# Altium footprint library cool_library.PcbLib: 1182 footprints (part 64 of 75)
Each footprint in its own frame and in the unit in brackets; x right, y up, seen from the top. Pads: shape width x height; smd on the part's side, far side on the other; paste and mask are expansions set on the pad; w line width, h text height; cw(c..) or ccw(c..) is an arc to the next point about the centre after c.
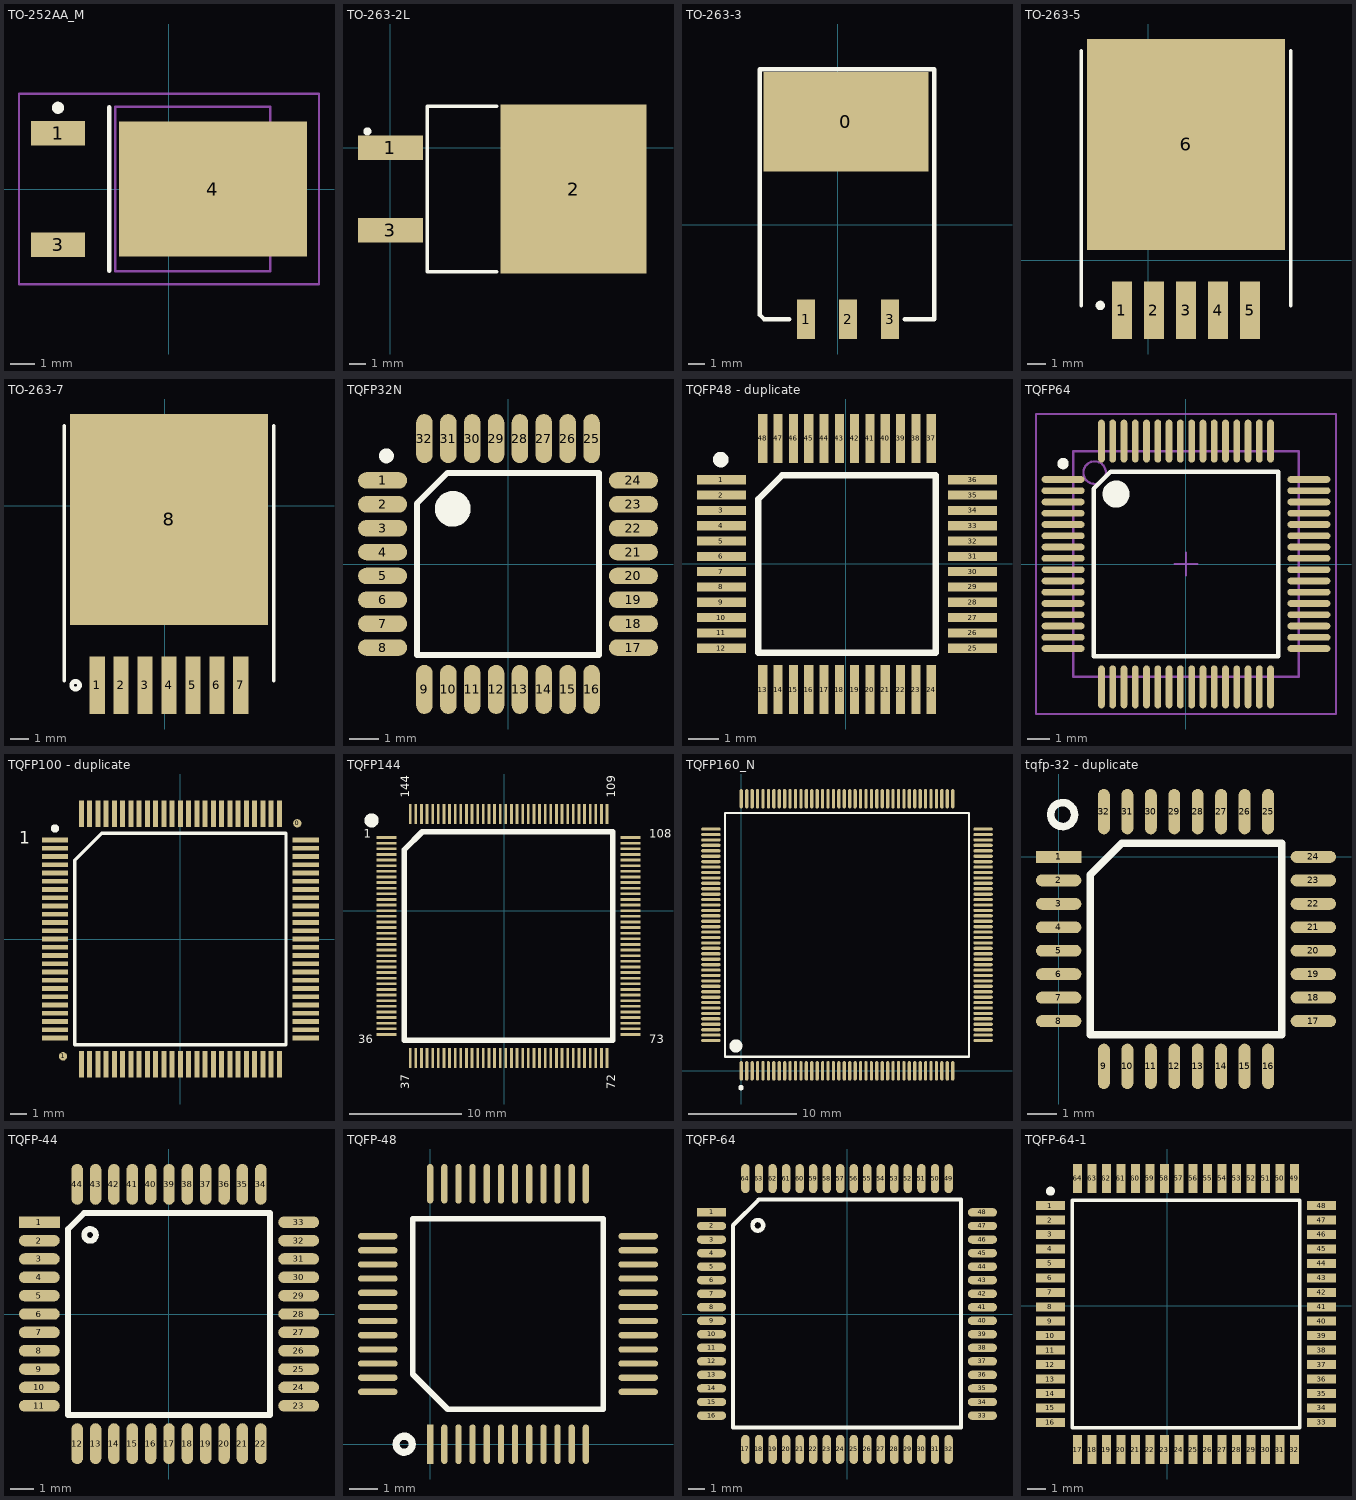
[diagram p63: the footprints below, top view; thin cyan lines are the x and y axes]

## TO-252AA_M [mm] "D-PAK, 4-Leads, Body 6.1x6.5mm, Pitch 2.28mm, Lead Span 9.9mm, IPC Low Density"
height 2.38
pads (3):
  rect 2.2x1 smd: 1(-4.55,2.28) 3(-4.55,-2.28)
  rect 7.7x5.55 smd: 4(1.8,0)
Top Overlay:
  circle w0.25: c-4.55,3.33 r0.125
  lines w0.2: -2.45,-3.35 -2.45,3.35
Mechanical 13:
  lines w0.1: -2.2,-3.375 4.15,-3.375 4.15,3.375 -2.2,3.375 -2.2,-3.375
Mechanical 15:
  lines w0.1: -0.5,0 0.5,0 ; 0,-0.5 0,0.5 ; -6.15,-3.9 6.15,-3.9 6.15,3.9 -6.15,3.9 -6.15,-3.9
3D body: height 2.38, standoff 0, extent -2.2,-3.375 4.15,3.375

## TO-263-2L [mm]
height 8.23
pads (3):
  rect 4x1.5 smd: 1(0,0) 3(0,-5.08)
  rect 9x10.4 smd: 2(11.303,-2.54)
Top Overlay:
  circle w0.25: c-1.423,1.01 r0.125
  lines w0.203: 6.577,-7.64 2.277,-7.64 2.277,2.56 6.577,2.56

## TO-263-3 [mm] "贴片封装"
pads (4):
  rect 10x6 smd: 0(0.508,6.223)
  rect 1.07x2.4 smd: 1(-1.905,-5.715) 2(0.635,-5.715) 3(3.175,-5.715)
Top Overlay:
  lines w0.254: -2.921,-5.715 -4.445,-5.715 -4.699,-5.461 -4.699,9.398 5.842,9.398 5.842,-5.715 4.064,-5.715

## TO-263-5 [mil]
pads (6):
  rect 42x120 smd: 1(-55,-104) 2(11.93,-104) 3(78.86,-104) 4(145.79,-104) 5(212.72,-104)
  rect 414x440 smd: 6(78.86,242)
Top Overlay:
  circle w9.84: c-99.92,-94 r4.92
  lines w7.87: -139.65,-94 -139.65,437.5 ; 297.36,-94 297.36,437.5

## TO-263-7 [mil]
pads (8):
  rect 32x120 smd: 1(-141,-375) 2(-91,-375) 3(-41,-375) 4(9,-375) 5(59,-375) 6(109,-375) 7(159,-375)
  rect 414x440 smd: 8(9,-29)
Top Overlay:
  circle w9.84: c-185.92,-375 r8.08
  lines w7.87: -209.5,-365 -209.5,166.5 ; 227.5,-365 227.5,166.5

## TQFP32N [mm] "TQFP, 32-Leads, Body 9.0x9.0mm (max), Pitch 0.80mm, IPC Medium Density"
height 1.2
pads (32):
  oval 1.65x0.55 smd: 1(-4.202,2.8) 2(-4.202,2) 3(-4.202,1.2) 4(-4.202,0.4) 5(-4.202,-0.4) 6(-4.202,-1.2) 7(-4.202,-2) 8(-4.202,-2.8) 17(4.202,-2.8) 18(4.202,-2) 19(4.202,-1.2) 20(4.202,-0.4) 21(4.202,0.4) 22(4.202,1.2) 23(4.202,2) 24(4.202,2.8)
  oval 0.55x1.65 smd: 9(-2.8,-4.202) 10(-2,-4.202) 11(-1.2,-4.202) 12(-0.4,-4.202) 13(0.4,-4.202) 14(1.2,-4.202) 15(2,-4.202) 16(2.8,-4.202) 25(2.8,4.202) 26(2,4.202) 27(1.2,4.202) 28(0.4,4.202) 29(-0.4,4.202) 30(-1.2,4.202) 31(-2,4.202) 32(-2.8,4.202)
Top Overlay:
  circle w0.6: c-1.85,1.85 r0.3
  circle w0.25: c-4.075,3.625 r0.125
  lines w0.2: -3.048,-3.048 -3.048,2.032 -2.032,3.048 3.048,3.048 3.048,-3.048 -3.048,-3.048
3D body: height 1.1, standoff 0, extent -4.509,-4.483 4.509,4.534

## TQFP48 - duplicate [mm]
pads (48):
  rect 1.6x0.3 smd: 1(-4.064,2.743) 2(-4.064,2.243) 3(-4.064,1.743) 4(-4.064,1.243) 5(-4.064,0.743) 6(-4.064,0.243) 7(-4.064,-0.257) 8(-4.064,-0.757) 9(-4.064,-1.257) 10(-4.064,-1.757) 11(-4.064,-2.257) 12(-4.064,-2.757) 25(4.136,-2.757) 26(4.136,-2.257) 27(4.136,-1.757) 28(4.136,-1.257) 29(4.136,-0.757) 30(4.136,-0.257) 31(4.136,0.243) 32(4.136,0.743) 33(4.136,1.243) 34(4.136,1.743) 35(4.136,2.243) 36(4.136,2.743)
  rect 0.3x1.6 smd: 13(-2.714,-4.107) 14(-2.214,-4.107) 15(-1.714,-4.107) 16(-1.214,-4.107) 17(-0.714,-4.107) 18(-0.214,-4.107) 19(0.286,-4.107) 20(0.786,-4.107) 21(1.286,-4.107) 22(1.786,-4.107) 23(2.286,-4.107) 24(2.786,-4.107) 37(2.786,4.093) 38(2.286,4.093) 39(1.786,4.093) 40(1.286,4.093) 41(0.786,4.093) 42(0.286,4.093) 43(-0.214,4.093) 44(-0.714,4.093) 45(-1.214,4.093) 46(-1.714,4.093) 47(-2.214,4.093) 48(-2.714,4.093)
Top Overlay:
  circle w0.254: c-4.089,3.404 r0.127
  lines w0.2: -2.864,-2.907 2.936,-2.907 2.936,2.893
  lines w0.203: -2.864,-2.907 -2.864,2.114 -2.085,2.893 2.936,2.893
3D body: height 1.1, standoff 0, extent -4.483,-4.509 4.534,4.509

## TQFP64 [mm]
pads (64):
  oval 1.9x0.3 smd: 1(-5.45,3.75) 2(-5.45,3.25) 3(-5.45,2.75) 4(-5.45,2.25) 5(-5.45,1.75) 6(-5.45,1.25) 7(-5.45,0.75) 8(-5.45,0.25) 9(-5.45,-0.25) 10(-5.45,-0.75) 11(-5.45,-1.25) 12(-5.45,-1.75) 13(-5.45,-2.25) 14(-5.45,-2.75) 15(-5.45,-3.25) 16(-5.45,-3.75) 33(5.45,-3.75) 34(5.45,-3.25) 35(5.45,-2.75) 36(5.45,-2.25) 37(5.45,-1.75) 38(5.45,-1.25) 39(5.45,-0.75) 40(5.45,-0.25) 41(5.45,0.25) 42(5.45,0.75) 43(5.45,1.25) 44(5.45,1.75) 45(5.45,2.25) 46(5.45,2.75) 47(5.45,3.25) 48(5.45,3.75)
  oval 0.3x1.9 smd: 17(-3.75,-5.45) 18(-3.25,-5.45) 19(-2.75,-5.45) 20(-2.25,-5.45) 21(-1.75,-5.45) 22(-1.25,-5.45) 23(-0.75,-5.45) 24(-0.25,-5.45) 25(0.25,-5.45) 26(0.75,-5.45) 27(1.25,-5.45) 28(1.75,-5.45) 29(2.25,-5.45) 30(2.75,-5.45) 31(3.25,-5.45) 32(3.75,-5.45) 49(3.75,5.45) 50(3.25,5.45) 51(2.75,5.45) 52(2.25,5.45) 53(1.75,5.45) 54(1.25,5.45) 55(0.75,5.45) 56(0.25,5.45) 57(-0.25,5.45) 58(-0.75,5.45) 59(-1.25,5.45) 60(-1.75,5.45) 61(-2.25,5.45) 62(-2.75,5.45) 63(-3.25,5.45) 64(-3.75,5.45)
Top Overlay:
  circle w0.6: c-3.1,3.1 r0.3
  circle w0.25: c-5.45,4.45 r0.125
  lines w0.2: -4.1,-4.1 4.1,-4.1 4.1,4.1 -3.342,4.1 -4.1,3.342 -4.1,-4.1
Mechanical 13:
  circle w0.1: c-4.05,4.05 r0.5
  lines w0.1: -5,-5 5,-5 5,5 -5,5 -5,-5
Mechanical 15:
  lines w0.1: -0.5,0 0.5,0 ; 0,-0.5 0,0.5 ; -6.65,-6.65 6.65,-6.65 6.65,6.65 -6.65,6.65 -6.65,-6.65
3D body: height 1, standoff -0.06, extent -6,-6.006 6,5.994

## TQFP100 - duplicate [mm]
pads (102):
  round 0.508 smd: 0(7.087,7.01) 1(-7.112,-7.112)
  rect 1.6x0.3 smd: 1(-7.6,6) 2(-7.6,5.5) 3(-7.6,5) 4(-7.6,4.5) 5(-7.6,4) 6(-7.6,3.5) 7(-7.6,3) 8(-7.6,2.5) 9(-7.6,2) 10(-7.6,1.5) 11(-7.6,1) 12(-7.6,0.5) 13(-7.6,0) 14(-7.6,-0.5) 15(-7.6,-1) 16(-7.6,-1.5) 17(-7.6,-2) 18(-7.6,-2.5) 19(-7.6,-3) 20(-7.6,-3.5) 21(-7.6,-4) 22(-7.6,-4.5) 23(-7.6,-5) 24(-7.6,-5.5) 25(-7.6,-6) 51(7.6,-6) 52(7.6,-5.5) 53(7.6,-5) 54(7.6,-4.5) 55(7.6,-4) 56(7.6,-3.5) 57(7.6,-3) 58(7.6,-2.5) 59(7.6,-2) 60(7.6,-1.5) 61(7.6,-1) 62(7.6,-0.5) 63(7.6,0) 64(7.6,0.5) 65(7.6,1) 66(7.6,1.5) 67(7.6,2) 68(7.6,2.5) 69(7.6,3) 70(7.6,3.5) 71(7.6,4) 72(7.6,4.5) 73(7.6,5) 74(7.6,5.5) 75(7.6,6)
  rect 0.3x1.6 smd: 26(-6,-7.6) 27(-5.5,-7.6) 28(-5,-7.6) 29(-4.5,-7.6) 30(-4,-7.6) 31(-3.5,-7.6) 32(-3,-7.6) 33(-2.5,-7.6) 34(-2,-7.6) 35(-1.5,-7.6) 36(-1,-7.6) 37(-0.5,-7.6) 38(0,-7.6) 39(0.5,-7.6) 40(1,-7.6) 41(1.5,-7.6) 42(2,-7.6) 43(2.5,-7.6) 44(3,-7.6) 45(3.5,-7.6) 46(4,-7.6) 47(4.5,-7.6) 48(5,-7.6) 49(5.5,-7.6) 50(6,-7.6) 76(6,7.6) 77(5.5,7.6) 78(5,7.6) 79(4.5,7.6) 80(4,7.6) 81(3.5,7.6) 82(3,7.6) 83(2.5,7.6) 84(2,7.6) 85(1.5,7.6) 86(1,7.6) 87(0.5,7.6) 88(0,7.6) 89(-0.5,7.6) 90(-1,7.6) 91(-1.5,7.6) 92(-2,7.6) 93(-2.5,7.6) 94(-3,7.6) 95(-3.5,7.6) 96(-4,7.6) 97(-4.5,7.6) 98(-5,7.6) 99(-5.5,7.6) 100(-6,7.6)
Top Overlay:
  circle w0.25: c-7.6,6.7 r0.125
  lines w0.2: -6.4,-6.4 -6.4,4.776 -4.776,6.4 6.4,6.4 6.4,-6.4 -6.4,-6.4
  text "1" at -9.779,5.766 h0.76
3D body: height 1.05, standoff -0.1, extent -7.949,-8.026 8.051,7.974

## TQFP144 [mil]
pads (144):
  rect 70x9.5 smd: 1(-412.2,256.3) 2(-412.2,236.61) 3(-412.2,216.93) 4(-412.2,197.24) 5(-412.2,177.56) 6(-412.2,157.87) 7(-412.2,138.19) 8(-412.2,118.5) 9(-412.2,98.82) 10(-412.2,79.13) 11(-412.2,59.45) 12(-412.2,39.76) 13(-412.2,20.08) 14(-412.2,0.39) 15(-412.2,-19.29) 16(-412.2,-38.98) 17(-412.2,-58.66) 18(-412.2,-78.35) 19(-412.2,-98.03) 20(-412.2,-117.72) 21(-412.2,-137.4) 22(-412.2,-157.09) 23(-412.2,-176.77) 24(-412.2,-196.46) 25(-412.2,-216.14) 26(-412.2,-235.83) 27(-412.2,-255.51) 28(-412.2,-275.2) 29(-412.2,-294.88) 30(-412.2,-314.57) 31(-412.2,-334.25) 32(-412.2,-353.94) 33(-412.2,-373.62) 34(-412.2,-393.31) 35(-412.2,-412.99) 36(-412.2,-432.68) 73(442.12,-432.68) 74(442.12,-412.99) 75(442.12,-393.31) 76(442.12,-373.62) 77(442.12,-353.94) 78(442.12,-334.25) 79(442.12,-314.57) 80(442.12,-294.88) 81(442.12,-275.2) 82(442.12,-255.51) 83(442.12,-235.83) 84(442.12,-216.14) 85(442.12,-196.46) 86(442.12,-176.77) 87(442.12,-157.09) 88(442.12,-137.4) 89(442.12,-117.72) 90(442.12,-98.03) 91(442.12,-78.35) 92(442.12,-58.66) 93(442.12,-38.98) 94(442.12,-19.29) 95(442.12,0.39) 96(442.12,20.08) 97(442.12,39.76) 98(442.12,59.45) 99(442.12,79.13) 100(442.12,98.82) 101(442.12,118.5) 102(442.12,138.19) 103(442.12,157.87) 104(442.12,177.56) 105(442.12,197.24) 106(442.12,216.93) 107(442.12,236.61) 108(442.12,256.3)
  rect 9.5x70 smd: 37(-329.53,-515.35) 38(-309.84,-515.35) 39(-290.16,-515.35) 40(-270.47,-515.35) 41(-250.79,-515.35) 42(-231.1,-515.35) 43(-211.42,-515.35) 44(-191.73,-515.35) 45(-172.05,-515.35) 46(-152.36,-515.35) 47(-132.68,-515.35) 48(-112.99,-515.35) 49(-93.31,-515.35) 50(-73.62,-515.35) 51(-53.94,-515.35) 52(-34.25,-515.35) 53(-14.57,-515.35) 54(5.12,-515.35) 55(24.8,-515.35) 56(44.49,-515.35) 57(64.17,-515.35) 58(83.86,-515.35) 59(103.54,-515.35) 60(123.23,-515.35) 61(142.91,-515.35) 62(162.6,-515.35) 63(182.28,-515.35) 64(201.97,-515.35) 65(221.65,-515.35) 66(241.34,-515.35) 67(261.02,-515.35) 68(280.71,-515.35) 69(300.39,-515.35) 70(320.08,-515.35) 71(339.76,-515.35) 72(359.45,-515.35) 109(359.45,338.98) 110(339.76,338.98) 111(320.08,338.98) 112(300.39,338.98) 113(280.71,338.98) 114(261.02,338.98) 115(241.34,338.98) 116(221.65,338.98) 117(201.97,338.98) 118(182.28,338.98) 119(162.6,338.98) 120(142.91,338.98) 121(123.23,338.98) 122(103.54,338.98) 123(83.86,338.98) 124(64.17,338.98) 125(44.49,338.98) 126(24.8,338.98) 127(5.12,338.98) 128(-14.57,338.98) 129(-34.25,338.98) 130(-53.94,338.98) 131(-73.62,338.98) 132(-93.31,338.98) 133(-112.99,338.98) 134(-132.68,338.98) 135(-152.36,338.98) 136(-172.05,338.98) 137(-191.73,338.98) 138(-211.42,338.98) 139(-231.1,338.98) 140(-250.79,338.98) 141(-270.47,338.98) 142(-290.16,338.98) 143(-309.84,338.98) 144(-329.53,338.98)
Top Overlay:
  circle w25: c-464.7,316.3 r12.5
  lines w19.68: -349.8,-452.95 -349.8,214.17 -287.4,276.58 379.72,276.58 379.72,-452.95 -349.8,-452.95
  text "72" at 387.8,-623.7 h30
  text "1" at -492.2,256.3 h30
  text "36" at -512.2,-463.7 h30
  text "37" at -332.2,-623.7 h30
  text "73" at 507.8,-463.7 h30
  text "108" at 507.8,256.3 h30
  text "109" at 387.8,396.3 h30
  text "144" at -332.2,396.3 h30

## TQFP160_N [mm]
pads (160):
  oval 0.3x1.8 smd: 1(0,0) 2(0.5,0) 3(1,0) 4(1.5,0) 5(2,0) 6(2.5,0) 7(3,0) 8(3.5,0) 9(4,0) 10(4.5,0) 11(5,0) 12(5.5,0) 13(6,0) 14(6.5,0) 15(7,0) 16(7.5,0) 17(8,0) 18(8.5,0) 19(9,0) 20(9.5,0) 21(10,0) 22(10.5,0) 23(11,0) 24(11.5,0) 25(12,0) 26(12.5,0) 27(13,0) 28(13.5,0) 29(14,0) 30(14.5,0) 31(15,0) 32(15.5,0) 33(16,0) 34(16.5,0) 35(17,0) 36(17.5,0) 37(18,0) 38(18.5,0) 39(19,0) 40(19.5,0) 81(19.5,25.1) 82(19,25.1) 83(18.5,25.1) 84(18,25.1) 85(17.5,25.1) 86(17,25.1) 87(16.5,25.1) 88(16,25.1) 89(15.5,25.1) 90(15,25.1) 91(14.5,25.1) 92(14,25.1) 93(13.5,25.1) 94(13,25.1) 95(12.5,25.1) 96(12,25.1) 97(11.5,25.1) 98(11,25.1) 99(10.5,25.1) 100(10,25.1) 101(9.5,25.1) 102(9,25.1) 103(8.5,25.1) 104(8,25.1) 105(7.5,25.1) 106(7,25.1) 107(6.5,25.1) 108(6,25.1) 109(5.5,25.1) 110(5,25.1) 111(4.5,25.1) 112(4,25.1) 113(3.5,25.1) 114(3,25.1) 115(2.5,25.1) 116(2,25.1) 117(1.5,25.1) 118(1,25.1) 119(0.5,25.1) 120(0,25.1)
  oval 1.8x0.3 smd: 41(22.3,2.8) 42(22.3,3.3) 43(22.3,3.8) 44(22.3,4.3) 45(22.3,4.8) 46(22.3,5.3) 47(22.3,5.8) 48(22.3,6.3) 49(22.3,6.8) 50(22.3,7.3) 51(22.3,7.8) 52(22.3,8.3) 53(22.3,8.8) 54(22.3,9.3) 55(22.3,9.8) 56(22.3,10.3) 57(22.3,10.8) 58(22.3,11.3) 59(22.3,11.8) 60(22.3,12.3) 61(22.3,12.8) 62(22.3,13.3) 63(22.3,13.8) 64(22.3,14.3) 65(22.3,14.8) 66(22.3,15.3) 67(22.3,15.8) 68(22.3,16.3) 69(22.3,16.8) 70(22.3,17.3) 71(22.3,17.8) 72(22.3,18.3) 73(22.3,18.8) 74(22.3,19.3) 75(22.3,19.8) 76(22.3,20.3) 77(22.3,20.8) 78(22.3,21.3) 79(22.3,21.8) 80(22.3,22.3) 121(-2.8,22.3) 122(-2.8,21.8) 123(-2.8,21.3) 124(-2.8,20.8) 125(-2.8,20.3) 126(-2.8,19.8) 127(-2.8,19.3) 128(-2.8,18.8) 129(-2.8,18.3) 130(-2.8,17.8) 131(-2.8,17.3) 132(-2.8,16.8) 133(-2.8,16.3) 134(-2.8,15.8) 135(-2.8,15.3) 136(-2.8,14.8) 137(-2.8,14.3) 138(-2.8,13.8) 139(-2.8,13.3) 140(-2.8,12.8) 141(-2.8,12.3) 142(-2.8,11.8) 143(-2.8,11.3) 144(-2.8,10.8) 145(-2.8,10.3) 146(-2.8,9.8) 147(-2.8,9.3) 148(-2.8,8.8) 149(-2.8,8.3) 150(-2.8,7.8) 151(-2.8,7.3) 152(-2.8,6.8) 153(-2.8,6.3) 154(-2.8,5.8) 155(-2.8,5.3) 156(-2.8,4.8) 157(-2.8,4.3) 158(-2.8,3.8) 159(-2.8,3.3) 160(-2.8,2.8)
Top Overlay:
  circle w0.6: c-0.5,2.3 r0.3
  circle w0.25: c-0.027,-1.547 r0.125
  lines w0.2: -1.5,1.3 -1.5,23.8 21,23.8 21,1.3 -1.5,1.3

## tqfp-32 - duplicate [mil]
pads (32):
  rect 60x15.75 smd: 1(0,0)
  oval 60x15.75 smd: 2(0,-31) 3(0,-62) 4(0,-93) 5(0,-124) 6(0,-155) 7(0,-186) 8(0,-217) 17(336.69,-217) 18(336.69,-186) 19(336.69,-155) 20(336.69,-124) 21(336.69,-93) 22(336.69,-62) 23(336.69,-31) 24(336.69,0)
  oval 15.75x60 smd: 9(59.84,-276.84) 10(90.84,-276.84) 11(121.84,-276.84) 12(152.84,-276.84) 13(183.84,-276.84) 14(214.84,-276.84) 15(245.84,-276.84) 16(276.84,-276.84) 25(276.84,59.84) 26(245.84,59.84) 27(214.84,59.84) 28(183.84,59.84) 29(152.84,59.84) 30(121.84,59.84) 31(90.84,59.84) 32(59.84,59.84)
Top Overlay:
  circle w10: c5.19,56 r15.81
  lines w10: 41.77,-235.07 294.91,-235.07 294.91,18.07 83.54,18.07 41.77,-23.7 41.77,-235.07

## TQFP-44 [mm]
pads (44):
  rect 1.778x0.5 smd: 1(-5.65,4)
  oval 1.778x0.5 smd: 2(-5.65,3.2) 3(-5.65,2.4) 4(-5.65,1.6) 5(-5.65,0.8) 6(-5.65,0) 7(-5.65,-0.8) 8(-5.65,-1.6) 9(-5.65,-2.4) 10(-5.65,-3.2) 11(-5.65,-4) 23(5.65,-4) 24(5.65,-3.2) 25(5.65,-2.4) 26(5.65,-1.6) 27(5.65,-0.8) 28(5.65,0) 29(5.65,0.8) 30(5.65,1.6) 31(5.65,2.4) 32(5.65,3.2) 33(5.65,4)
  oval 0.5x1.778 smd: 12(-4,-5.65) 13(-3.2,-5.65) 14(-2.4,-5.65) 15(-1.6,-5.65) 16(-0.8,-5.65) 17(0,-5.65) 18(0.8,-5.65) 19(1.6,-5.65) 20(2.4,-5.65) 21(3.2,-5.65) 22(4,-5.65) 34(4,5.65) 35(3.2,5.65) 36(2.4,5.65) 37(1.6,5.65) 38(0.8,5.65) 39(0,5.65) 40(-0.8,5.65) 41(-1.6,5.65) 42(-2.4,5.65) 43(-3.2,5.65) 44(-4,5.65)
Top Overlay:
  circle w0.254: c-3.441,3.446 r0.255
  lines w0.127: -4.4,3.7 -4.4,3.7
  lines w0.25: -4.4,-4.4 4.4,-4.4 4.4,4.4
  lines w0.254: -4.4,-4.4 -4.4,3.7 -3.7,4.4 4.4,4.4

## TQFP-48 [mm]
pads (48):
  rect 0.22x1.4 smd: 1(0,0)
  oval 0.22x1.4 smd: 2(0.5,0) 3(1,0) 4(1.5,0) 5(2,0) 6(2.5,0) 7(3,0) 8(3.5,0) 9(4,0) 10(4.5,0) 11(5,0) 12(5.5,0) 25(5.5,9.2) 26(5,9.2) 27(4.5,9.2) 28(4,9.2) 29(3.5,9.2) 30(3,9.2) 31(2.5,9.2) 32(2,9.2) 33(1.5,9.2) 34(1,9.2) 35(0.5,9.2) 36(0,9.2)
  oval 1.4x0.22 smd: 13(7.35,1.85) 14(7.35,2.35) 15(7.35,2.85) 16(7.35,3.35) 17(7.35,3.85) 18(7.35,4.35) 19(7.35,4.85) 20(7.35,5.35) 21(7.35,5.85) 22(7.35,6.35) 23(7.35,6.85) 24(7.35,7.35) 37(-1.85,7.35) 38(-1.85,6.85) 39(-1.85,6.35) 40(-1.85,5.85) 41(-1.85,5.35) 42(-1.85,4.85) 43(-1.85,4.35) 44(-1.85,3.85) 45(-1.85,3.35) 46(-1.85,2.85) 47(-1.85,2.35) 48(-1.85,1.85)
Top Overlay:
  circle w0.254: c-0.919,0 r0.284
  lines w0.2: -0.615,2.47 -0.615,7.965 6.115,7.965 6.115,1.235 0.62,1.235 -0.615,2.47

## TQFP-64 [mm]
pads (64):
  rect 1.724x0.5 smd: 1(-8,6)
  oval 1.724x0.5 smd: 2(-8,5.2) 3(-8,4.4) 4(-8,3.6) 5(-8,2.8) 6(-8,2) 7(-8,1.2) 8(-8,0.4) 9(-8,-0.4) 10(-8,-1.2) 11(-8,-2) 12(-8,-2.8) 13(-8,-3.6) 14(-8,-4.4) 15(-8,-5.2) 16(-8,-6) 33(8,-6) 34(8,-5.2) 35(8,-4.4) 36(8,-3.6) 37(8,-2.8) 38(8,-2) 39(8,-1.2) 40(8,-0.4) 41(8,0.4) 42(8,1.2) 43(8,2) 44(8,2.8) 45(8,3.6) 46(8,4.4) 47(8,5.2) 48(8,6)
  oval 0.5x1.724 smd: 17(-6,-8) 18(-5.2,-8) 19(-4.4,-8) 20(-3.6,-8) 21(-2.8,-8) 22(-2,-8) 23(-1.2,-8) 24(-0.4,-8) 25(0.4,-8) 26(1.2,-8) 27(2,-8) 28(2.8,-8) 29(3.6,-8) 30(4.4,-8) 31(5.2,-8) 32(6,-8) 49(6,8) 50(5.2,8) 51(4.4,8) 52(3.6,8) 53(2.8,8) 54(2,8) 55(1.2,8) 56(0.4,8) 57(-0.4,8) 58(-1.2,8) 59(-2,8) 60(-2.8,8) 61(-3.6,8) 62(-4.4,8) 63(-5.2,8) 64(-6,8)
Top Overlay:
  circle w0.254: c-5.268,5.238 r0.316
  lines w0.254: -6.73,-6.7 6.732,-6.7 6.732,6.762 -5.206,6.762 -6.73,5.238 -6.73,-6.7

## TQFP-64-1 [mm]
pads (64):
  rect 1.6x0.5 smd: 1(-6.459,5.543) 2(-6.459,4.743) 3(-6.459,3.943) 4(-6.459,3.143) 5(-6.459,2.343) 6(-6.459,1.543) 7(-6.459,0.743) 8(-6.459,-0.057) 9(-6.459,-0.857) 10(-6.459,-1.657) 11(-6.459,-2.457) 12(-6.459,-3.257) 13(-6.459,-4.057) 14(-6.459,-4.857) 15(-6.459,-5.657) 16(-6.459,-6.457) 33(8.541,-6.457) 34(8.541,-5.657) 35(8.541,-4.857) 36(8.541,-4.057) 37(8.541,-3.257) 38(8.541,-2.457) 39(8.541,-1.657) 40(8.541,-0.857) 41(8.541,-0.057) 42(8.541,0.743) 43(8.541,1.543) 44(8.541,2.343) 45(8.541,3.143) 46(8.541,3.943) 47(8.541,4.743) 48(8.541,5.543)
  rect 0.5x1.6 smd: 17(-4.959,-7.957) 18(-4.159,-7.957) 19(-3.359,-7.957) 20(-2.559,-7.957) 21(-1.759,-7.957) 22(-0.959,-7.957) 23(-0.159,-7.957) 24(0.641,-7.957) 25(1.441,-7.957) 26(2.241,-7.957) 27(3.041,-7.957) 28(3.841,-7.957) 29(4.641,-7.957) 30(5.441,-7.957) 31(6.241,-7.957) 32(7.041,-7.957) 49(7.041,7.043) 50(6.241,7.043) 51(5.441,7.043) 52(4.641,7.043) 53(3.841,7.043) 54(3.041,7.043) 55(2.241,7.043) 56(1.441,7.043) 57(0.641,7.043) 58(-0.159,7.043) 59(-0.959,7.043) 60(-1.759,7.043) 61(-2.559,7.043) 62(-3.359,7.043) 63(-4.159,7.043) 64(-4.959,7.043)
Top Overlay:
  circle w0.25: c-6.459,6.343 r0.125
  lines w0.2: -5.259,-6.757 7.341,-6.757 7.341,5.843 -5.259,5.843 -5.259,-6.757